# Altium footprint library My Footprint.PcbLib: 268 footprints (part 5 of 17)
Each footprint in its own frame and in the unit in brackets; x right, y up, seen from the top. Pads: shape width x height; smd on the part's side, far side on the other; paste and mask are expansions set on the pad; w line width, h text height; cw(c..) or ccw(c..) is an arc to the next point about the centre after c.
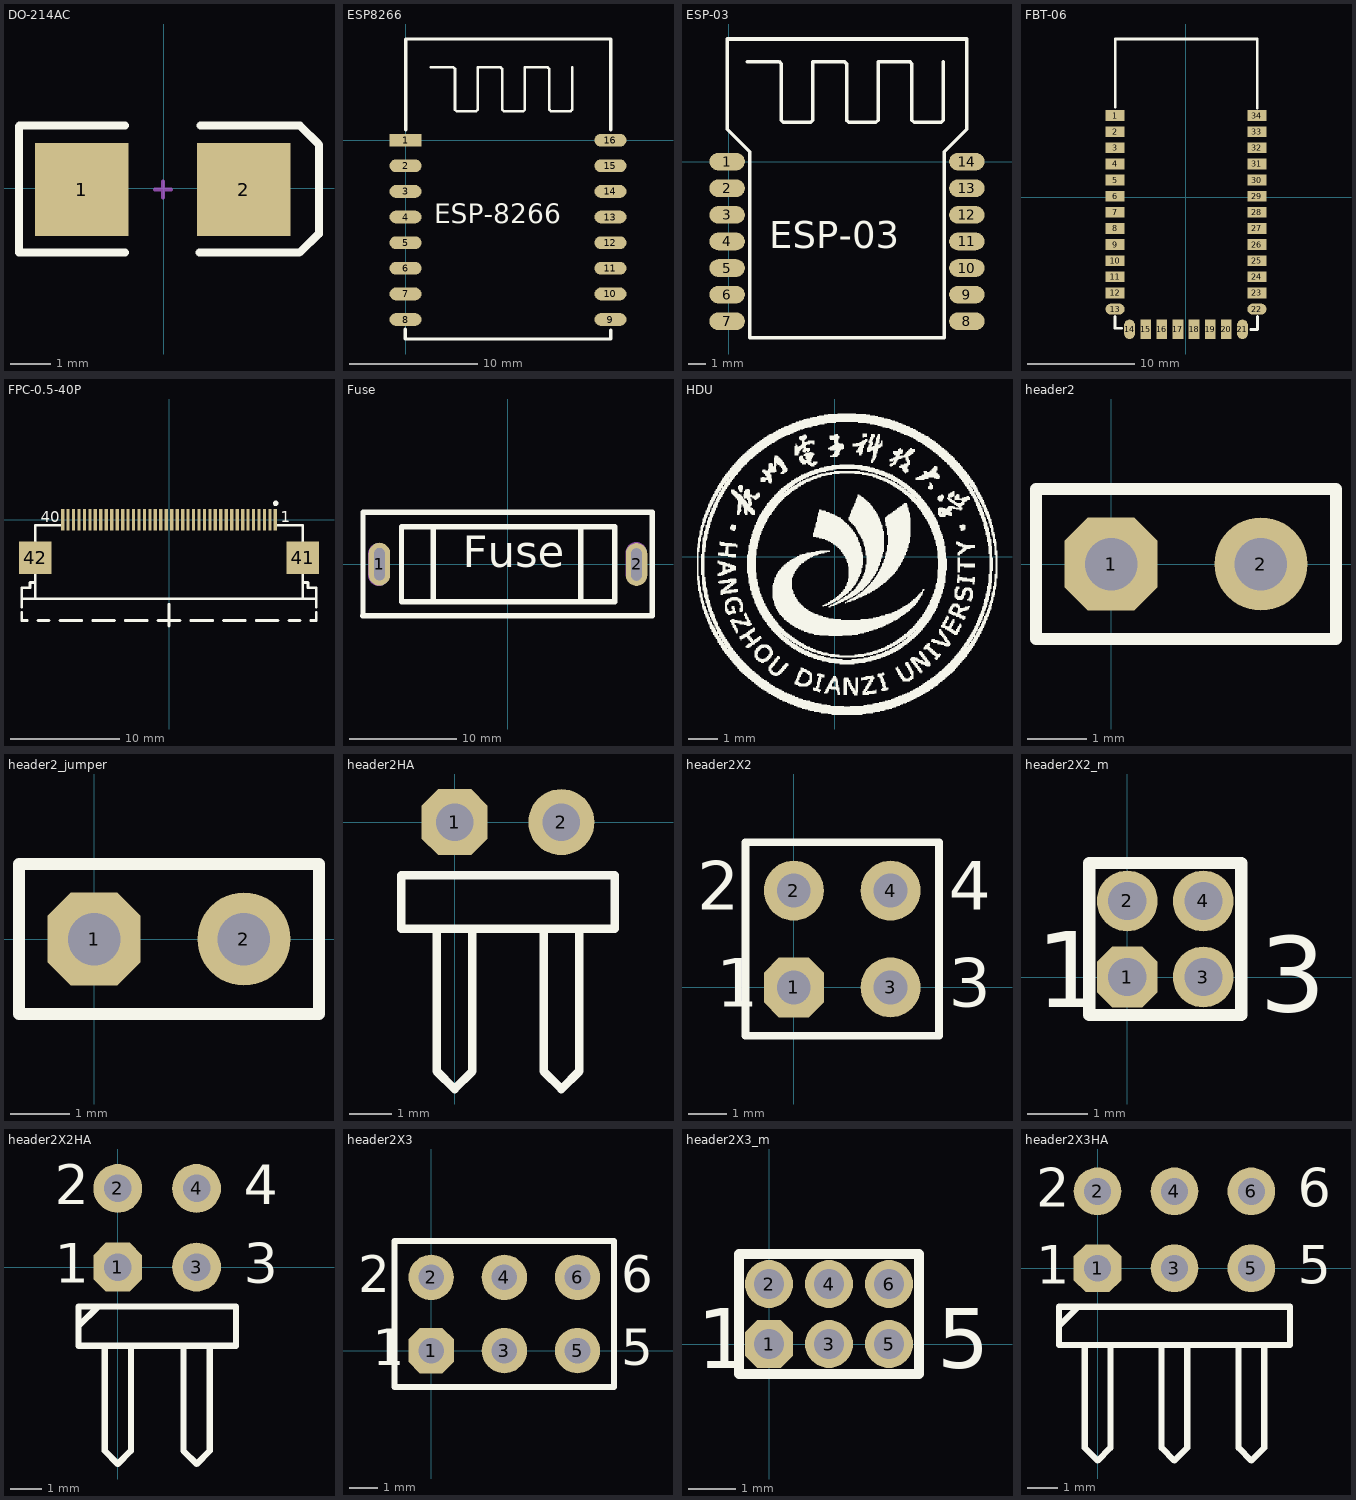
[diagram p4: the footprints below, top view; thin cyan lines are the x and y axes]

## DO-214AC [mm] "SMA"
pads (2):
  rect 2.3x2.3 smd: 1(-2.021,-0.025) 2(1.971,-0.025)
Top Overlay:
  lines w0.2: -3.571,-1.575 -3.571,1.525 ; -3.556,-1.575 -0.956,-1.575 ; -3.556,1.549 -0.956,1.549 ; 0.877,-1.575 3.327,-1.575 ; 0.903,1.549 3.353,1.549 ; 3.36,-1.568 3.81,-1.118 ; 3.36,1.542 3.81,1.092 ; 3.821,-1.125 3.821,1.075
Mechanical 1:
  lines w0.1: -0.225,-0.025 0.175,-0.025 ; -0.025,-0.225 -0.025,0.175

## ESP8266 [mm]
pads (16):
  rect 2.5x1 smd: 1(0,0)
  oval 2.5x1 smd: 2(0,-2) 3(0,-4) 4(0,-6) 5(0,-8) 6(0,-10) 7(0,-12) 8(0,-14) 9(16,-14) 10(16,-12) 11(16,-10) 12(16,-8) 13(16,-6) 14(16,-4) 15(16,-2) 16(16,0)
Top Overlay:
  lines w0.2: 1.956,5.69 3.734,5.69 3.861,5.563 3.861,2.388 3.988,2.261 5.512,2.261 5.639,2.388 5.639,5.69 7.417,5.69 7.544,5.563 7.544,2.388 7.671,2.261 9.195,2.261 9.322,2.388 9.322,5.69 11.1,5.69 11.227,5.563 11.227,2.388 11.354,2.261 12.878,2.261 13.005,2.388 13.005,5.69
  lines w0.254: -0.025,-14.757 -0.025,-15.519 16.027,-15.519 16.027,-14.834 ; 0.025,0.813 0.025,7.899 16.027,7.899 16.027,0.813
  text "ESP-8266" at 2.261,-6.502 h1.52

## ESP-03 [mm]
pads (14):
  oval 2x1 smd: 1(-0.102,-0.006) 2(-0.102,-1.506) 3(-0.102,-3.006) 4(-0.102,-4.506) 5(-0.102,-6.006) 6(-0.102,-7.506) 7(-0.102,-9.006) 8(13.411,-9.006) 9(13.411,-7.506) 10(13.411,-6.006) 11(13.411,-4.506) 12(13.411,-3.006) 13(13.411,-1.506) 14(13.411,-0.006)
Top Overlay:
  lines w0.2: 1.041,5.639 2.819,5.639 2.946,5.512 2.946,2.337 3.073,2.21 4.597,2.21 4.724,2.337 4.724,5.639 6.502,5.639 6.629,5.512 6.629,2.337 6.756,2.21 8.28,2.21 8.407,2.337 8.407,5.639 10.185,5.639 10.312,5.512 10.312,2.337 10.439,2.21 11.963,2.21 12.09,2.337 12.09,5.639 ; -0.102,1.829 1.168,0.559 1.168,-9.931 12.141,-9.931 12.141,0.559 13.411,1.829 13.411,6.909 -0.102,6.909 -0.102,1.829
  text "ESP-03" at 2.261,-4.877 h1.52

## FBT-06 [mm]
pads (34):
  rect 1.8x1 all layers, no hole: 1(-6.553,7.595) 2(-6.553,6.096) 3(-6.553,4.597) 4(-6.553,3.099) 5(-6.553,1.6) 6(-6.553,0.102) 7(-6.553,-1.397) 8(-6.553,-2.896) 9(-6.553,-4.394) 10(-6.553,-5.893) 11(-6.553,-7.391) 12(-6.553,-8.89) 23(6.629,-8.89) 24(6.629,-7.391) 25(6.629,-5.893) 26(6.629,-4.394) 27(6.629,-2.896) 28(6.629,-1.397) 29(6.629,0.102) 30(6.629,1.6) 31(6.629,3.099) 32(6.629,4.597) 33(6.629,6.096) 34(6.629,7.595)
  oval 1.8x1 all layers, no hole: 13(-6.553,-10.389) 22(6.629,-10.389)
  oval 1x1.8 all layers, no hole: 14(-5.207,-12.268) 21(5.283,-12.268)
  rect 1x1.8 all layers, no hole: 15(-3.708,-12.268) 16(-2.21,-12.268) 17(-0.711,-12.268) 18(0.787,-12.268) 19(2.286,-12.268) 20(3.785,-12.268)
Top Overlay:
  lines w0.254: -6.553,-11.074 -6.553,-12.167 -5.944,-12.167 ; -6.528,8.382 -6.528,14.707 6.655,14.707 6.655,8.306 ; 6.045,-12.294 6.68,-12.294 6.68,-11.074

## FPC-0.5-40P [mm]
height 1
pads (42):
  rect 0.3x2 smd: 1(9.75,0) 2(9.25,0) 3(8.75,0) 4(8.25,0) 5(7.75,0) 6(7.25,0) 7(6.75,0) 8(6.25,0) 9(5.75,0) 10(5.25,0) 11(4.75,0) 12(4.25,0) 13(3.75,0) 14(3.25,0) 15(2.75,0) 16(2.25,0) 17(1.75,0) 18(1.25,0) 19(0.75,0) 20(0.25,0) 21(-0.25,0) 22(-0.75,0) 23(-1.25,0) 24(-1.75,0) 25(-2.25,0) 26(-2.75,0) 27(-3.25,0) 28(-3.75,0) 29(-4.25,0) 30(-4.75,0) 31(-5.25,0) 32(-5.75,0) 33(-6.25,0) 34(-6.75,0) 35(-7.25,0) 36(-7.75,0) 37(-8.25,0) 38(-8.75,0) 39(-9.25,0) 40(-9.75,0)
  rect 3x3 smd: 41(12.25,-3.49) 42(-12.25,-3.49)
Top Overlay:
  circle w0.25: c9.775,1.51 r0.125
  lines w0.254: -13.5,-8.49 -13.5,-9.24 -13,-9.24 ; -13.5,-7.99 -13.5,-7.24 ; -12.25,-5.74 -12.75,-5.74 -12.75,-6.24 -13.5,-6.24 -13.5,-7.24 ; -12.25,-4.99 -12.25,-7.24 ; -12.25,-1.99 -12.25,-0.49 -10,-0.49 ; -12,-9.24 -11,-9.24 ; -10,-9.24 -8,-9.24 ; -7,-9.24 -5,-9.24 ; -4,-9.24 -2,-9.24 ; -1,-9.24 1,-9.24 ; 0,-9.74 0,-7.74 ; 2,-9.24 4,-9.24 ; 5,-9.24 7,-9.24 ; 8,-9.24 10,-9.24 ; 10,-0.49 12.25,-0.49 12.25,-1.99 ; 11,-9.24 12,-9.24 ; 12.25,-5.74 12.75,-5.74 12.75,-6.24 13.5,-6.24 13.5,-7.24 ; 12.25,-4.99 12.25,-7.24 ; 13,-9.24 13.5,-9.24 13.5,-8.49 ; 13.5,-7.99 13.5,-7.24 ; -13.5,-7.24 -12.25,-7.24 ; -12.25,-7.24 12.25,-7.24 ; 12.25,-7.24 13.5,-7.24
  text "40" at -11.75,-0.24 h1.02
  text "1" at 10.25,-0.24 h1.02
3D body "ffc_fpc_affc20-40-050-shb-t.stp": height 2.05, standoff -0.05, extent -12.75,-5.5 12.75,-0.164

## Fuse [mm] "保险丝"
pads (2):
  oval 2x4 hole 1 slot 3 at 90 deg: 1(-11.97,0.015) 2(11.97,-0.015)
Top Overlay:
  lines w0.5: -6.95,-3.345 -6.95,3.395 ; 6.77,-3.395 6.77,3.465 ; -13.54,-4.785 13.43,-4.785 13.43,4.845 -13.51,4.845 -13.51,-4.755 -13.54,-4.785 ; -9.92,-3.485 9.93,-3.485 9.93,3.495 -9.92,3.495 -9.92,-3.485
  text "Fuse" at -4.191,-1.27 h5.08
Mechanical 1:
  lines w1: -12.03,-0.975 -12.03,1.025 ; 11.94,-1.005 11.94,0.995
Mechanical 2:
  lines w2.016: -12.03,-1.005 -12.03,0.995 ; 11.94,-0.935 11.94,1.065
3D body "Fuse.STEP": height 8.62, standoff -4.27, extent -10.788,-2.986 10.49,3.204

## HDU [mil]
Top Overlay:
  drawing of 6289 lines, arcs and shapes, not listed

## header2 [mil]
pads (2):
  oct 62x62 hole 35: 1(0,0)
  round 62 hole 35: 2(100,0)
Top Overlay:
  lines w8: -50,-50 -50,50 150,50 150,-50 -50,-50
3D body "HEADER 2.STEP": height 397.64, standoff -59.06, extent -50,-50 150,50

## header2_jumper [mil] "跳线帽"
pads (2):
  oct 62x62 hole 35: 1(0,0)
  round 62 hole 35: 2(100,0)
Top Overlay:
  lines w8: -50,-50 -50,50 150,50 150,-50 -50,-50
3D body "Jumper -2.STEP": height 374.02, standoff -102.36, extent -48.42,-50 148.43,50

## header2HA [mil]
pads (2):
  oct 62x62 hole 35: 1(0,0)
  round 62 hole 35: 2(100,0)
Top Overlay:
  lines w8: -16.67,-100 -16.67,-233.33 0,-250 16.67,-233.33 16.67,-100 ; 83.33,-100 83.33,-233.33 100,-250 116.67,-233.33 116.67,-100 ; -50,-100 150,-100 150,-50 -50,-50 -50,-100
3D body "HEADER 2H.STEP": height 170.28, standoff -118.11, extent -50,-275.59 150,50

## header2X2 [mil]
pads (4):
  oct 62x62 hole 35: 1(0,0)
  round 62 hole 35: 2(0,100) 3(100,0) 4(100,100)
Top Overlay:
  lines w8: -50,-50 -50,150 150,150 150,-50 -50,-50
  text "1" at -80,-20 h50
  text "2" at -100,80 h50
  text "4" at 160,80 h50
  text "3" at 160,-20 h50
3D body "HEADER 2X2.STEP": height 397.64, standoff -59.06, extent -50,-50 150,150

## header2X2_m [mil]
pads (4):
  oct 40x40 hole 25: 1(0,0)
  round 40 hole 25: 2(0,50) 3(50,0) 4(50,50)
Top Overlay:
  lines w8: -25,-25 75,-25 75,75 -25,75 -25,-25
  text "1" at -60,-20 h50
  text "3" at 87.25,-22.74 h50

## header2X2HA [mil]
pads (4):
  oct 62x62 hole 35: 1(0,0)
  round 62 hole 35: 2(0,100) 3(100,0) 4(100,100)
Top Overlay:
  lines w8: -50,-75 -25,-50 ; -16.67,-100 -16.67,-233.33 0,-250 16.67,-233.33 16.67,-100 ; 83.33,-100 83.33,-233.33 100,-250 116.67,-233.33 116.67,-100 ; -50,-100 150,-100 150,-50 -50,-50 -50,-100
  text "3" at 160,-20 h50
  text "4" at 160,80 h50
  text "2" at -80,80 h50
  text "1" at -80,-20 h50

## header2X3 [mil]
pads (6):
  oct 62x62 hole 35: 1(0,0)
  round 62 hole 35: 2(0,100) 3(100,0) 4(100,100) 5(200,0) 6(200,100)
Top Overlay:
  lines w8: 58.33,-50 250,-50 ; 250,-50 -50,-50 -50,150 250,150 250,-50
  text "1" at -80,-20 h50
  text "2" at -100,80 h50
  text "5" at 260,-20 h50
  text "6" at 260,80 h50
3D body "HEADER 3X2.STEP": height 397.64, standoff -59.06, extent -50,-50 250,150

## header2X3_m [mil]
pads (6):
  oct 40x40 hole 25: 1(0,0)
  round 40 hole 25: 2(0,50) 3(50,0) 4(50,50) 5(100,0) 6(100,50)
Top Overlay:
  lines w8: -25,-25 125,-25 125,75 -25,75 -25,-25
  text "1" at -60,-20 h50
  text "5" at 140,-20 h50

## header2X3HA [mil]
pads (6):
  oct 62x62 hole 35: 1(0,0)
  round 62 hole 35: 2(0,100) 3(100,0) 4(100,100) 5(200,0) 6(200,100)
Top Overlay:
  lines w8: -50,-75 -25,-50 ; -16.67,-100 -16.67,-233.33 0,-250 16.67,-233.33 16.67,-100 ; 83.33,-100 83.33,-233.33 100,-250 116.67,-233.33 116.67,-100 ; 183.33,-100 183.33,-233.33 200,-250 216.67,-233.33 216.67,-100 ; -50,-100 -50,-50 250,-50 250,-100 -50,-100
  text "6" at 260,80 h50
  text "5" at 260,-20 h50
  text "1" at -80,-20 h50
  text "2" at -80,80 h50